# Altium footprint library JL_PCB.PCBLIB: 1129 footprints (part 69 of 72)
Each footprint in its own frame and in the unit in brackets; x right, y up, seen from the top. Pads: shape width x height; smd on the part's side, far side on the other; paste and mask are expansions set on the pad; w line width, h text height; cw(c..) or ccw(c..) is an arc to the next point about the centre after c.
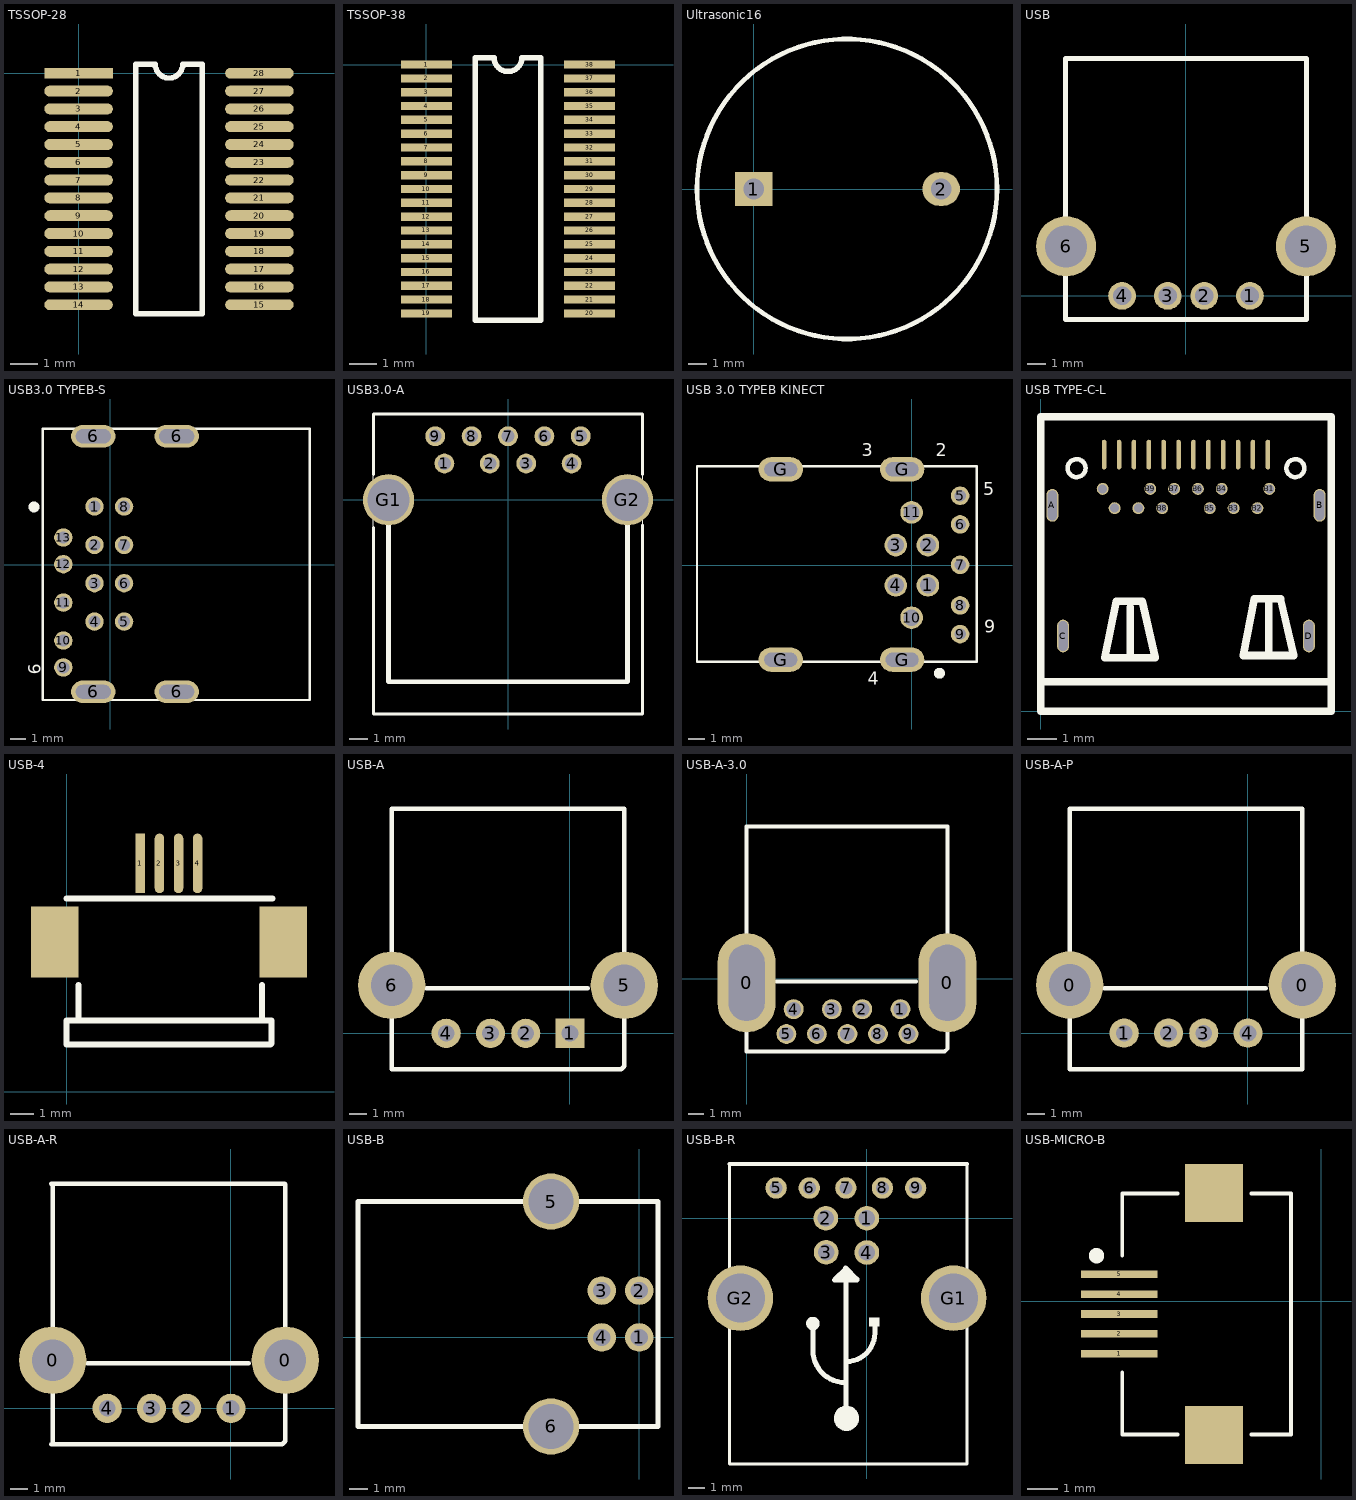
[diagram p68: the footprints below, top view; thin cyan lines are the x and y axes]

## TSSOP-28 [mm]
pads (28):
  rect 2.5x0.4 smd: 1(0,0)
  oval 2.5x0.4 smd: 2(0,-0.65) 3(0,-1.3) 4(0,-1.95) 5(0,-2.6) 6(0,-3.25) 7(0,-3.9) 8(0,-4.55) 9(0,-5.2) 10(0,-5.85) 11(0,-6.5) 12(0,-7.15) 13(0,-7.8) 14(0,-8.45) 15(6.6,-8.45) 16(6.6,-7.8) 17(6.6,-7.15) 18(6.6,-6.5) 19(6.6,-5.85) 20(6.6,-5.2) 21(6.6,-4.55) 22(6.6,-3.9) 23(6.6,-3.25) 24(6.6,-2.6) 25(6.6,-1.95) 26(6.6,-1.3) 27(6.6,-0.65) 28(6.6,0)
TopOverlay:
  lines w0.2: 2.085,-8.775 4.515,-8.775 4.515,0.325 3.8,0.325 cw(c3.3,0.325) 2.8,0.325 2.085,0.325 2.085,-8.775
3D body "TSSOP28.STEP": height 1.05, standoff 0, extent -0.049,-9.116 6.551,0.684

## TSSOP-38 [mm]
pads (38):
  rect 1.85x0.3 smd: 1(0,0) 2(0,-0.5) 3(0,-1) 4(0,-1.5) 5(0,-2) 6(0,-2.5) 7(0,-3) 8(0,-3.5) 9(0,-4) 10(0,-4.5) 11(0,-5) 12(0,-5.5) 13(0,-6) 14(0,-6.5) 15(0,-7) 16(0,-7.5) 17(0,-8) 18(0,-8.5) 19(0,-9) 20(5.9,-9) 21(5.9,-8.5) 22(5.9,-8) 23(5.9,-7.5) 24(5.9,-7) 25(5.9,-6.5) 26(5.9,-6) 27(5.9,-5.5) 28(5.9,-5) 29(5.9,-4.5) 30(5.9,-4) 31(5.9,-3.5) 32(5.9,-3) 33(5.9,-2.5) 34(5.9,-2) 35(5.9,-1.5) 36(5.9,-1) 37(5.9,-0.5) 38(5.9,0)
TopOverlay:
  lines w0.2: 1.76,-9.25 1.76,0.25 2.45,0.25 ccw(c2.95,0.25) 3.45,0.25 4.14,0.25 4.14,-9.25 1.76,-9.25

## Ultrasonic16 [mm]
pads (2):
  rect 2x1.8 hole 1.1: 1(0,0)
  oval 2x1.8 hole 1.1: 2(10,0)
TopOverlay:
  circle w0.254: c4.978,0 r8

## USB [mm]
pads (6):
  round 1.524 hole 1: 1(3.503,0) 2(1.003,0) 3(-0.997,0) 4(-3.497,0)
  round 3.3 hole 2.3: 5(6.573,2.71) 6(-6.567,2.71)
TopOverlay:
  lines w0.254: -6.597,-1.295 -6.597,13.005 6.603,13.005 6.603,-1.295 -6.597,-1.295

## USB3.0 TYPEB-S [mm] "KINECT USB3.0 TYPEB-S WITH 12V POWER"
pads (17):
  round 1.2 hole 0.8: 1(-1.016,3.81) 2(-1.016,1.31) 3(-1.016,-1.19) 4(-1.016,-3.69) 5(0.914,-3.69) 6(0.914,-1.19) 7(0.914,1.31) 8(0.914,3.81) 9(-3.048,-6.68) 10(-3.048,-4.928) 11(-3.048,-2.451) 12(-3.048,0.051) 13(-3.048,1.791)
  oval 2.9x1.45 hole 0.889 slot 2.286 at 0 deg: 6(-1.092,-8.268) 6(4.343,-8.268)
  oval 2.9x1.45 hole 0.914 slot 2.286 at 0 deg: 6(-1.092,8.395) 6(4.343,8.395)
TopOverlay:
  circle w0.5: c-4.965,3.785 r0.102
  lines w0.152: 13.005,-8.801 -4.394,-8.801 -4.394,8.877 13.005,8.877 ; 13.03,-8.801 13.03,8.877
  text "9" at -5.347,-6.452 h0.8
BottomOverlay:
  text "4" at -1.448,-5.118 h0.8
  text "5" at 1.994,-4.14 h0.8
  text "8" at 1.791,4.089 h0.8
  text "13" at -5.512,1.295 h0.8

## USB3.0-A [mil] "USB3.0-A"
pads (11):
  round 43 hole 28: 1(-137.79,78.74) 2(-39.37,78.74) 3(39.37,78.74) 4(137.79,78.74) 5(157.48,137.79) 6(78.74,137.79) 7(0,137.79) 8(-78.74,137.79) 9(-157.48,137.79)
  round 111 hole 91: G1(-258.66,0) G2(258.66,0)
TopOverlay:
  lines w1: -291.34,-463.78 -291.34,185.83 ; 291.34,-463.78 291.34,185.83
  lines w6: -291.34,-60 -291.34,-463.78 291.34,-463.78 291.34,-55 ; -291.34,55 -291.34,185.83 291.34,185.83 291.34,55
  lines w10: -258.66,0 -258.66,-393.66 258.66,-393.66 258.66,0
3D body "85r4853_1932258-1.stp": height 300.2, standoff -150.77, extent -316.93,-468.82 316.93,180

## USB 3.0 TYPEB KINECT [mm] "USB 3.0 TYPEB KINECT"
pads (15):
  round 1.4 hole 1: 1(1.016,-1.245) 2(1.016,1.245) 3(-0.978,1.245) 4(-0.978,-1.245) 10(0,-3.251) 11(0,3.277)
  round 1.15 hole 0.7: 5(3.01,4.305) 6(3.01,2.527) 7(3.01,0.025) 8(3.01,-2.489) 9(3.01,-4.267)
  oval 2.75x1.5 hole 0.889 slot 2.032 at 0 deg: G(-8.103,-5.855) G(-8.103,5.944) G(-0.584,-5.855) G(-0.584,5.944)
TopOverlay:
  circle w0.5: c1.727,-6.693 r0.089
  lines w0.152: -13.297,-5.969 -13.297,6.147 4.051,6.147 4.051,-5.969 -13.297,-5.969
  text "5" at 4.432,4.331 h0.8
  text "9" at 4.496,-4.191 h0.8
  text "4" at -2.705,-7.404 h0.8
  text "2" at 1.486,6.744 h0.8
  text "3" at -3.086,6.756 h0.8
BottomOverlay:
  circle w0.5: c1.676,-2.819 r0.114
  text "2" at 1.753,2.451 h0.7
  text "3" at -2.172,1.168 h0.7
  text "4" at -2.134,-1.537 h0.7
  text "9" at 4.953,-4.14 h0.7
  text "10" at -0.978,-3.416 h0.7
  text "11" at -0.953,3.289 h0.7
  text "5" at 4.902,4.394 h0.7

## USB TYPE-C-L [mm]
pads (28):
  oval 0.4x1.1 hole 0.3 slot 1 at 90 deg: A(0.385,6.92) B(9.365,6.92) C(0.745,2.53) D(9.005,2.53)
  oval 0.15x1 smd: A1(2.125,8.625) A2(2.625,8.625) A3(3.125,8.625) A4(3.625,8.625) A5(4.125,8.625) A6(4.625,8.625) A7(5.125,8.625) A8(5.625,8.625) A9(6.125,8.625) A10(6.625,8.625) A11(7.125,8.625) A12(7.625,8.625)
  round 0.4 hole 0.3: B1(7.675,7.475) B2(7.275,6.825) B3(6.475,6.825) B4(6.075,7.475) B5(5.675,6.825) B6(5.275,7.475) B7(4.475,7.475) B8(4.075,6.825) B9(3.675,7.475) B10(3.275,6.825) B11(2.475,6.825) B12(2.075,7.475)
TopOverlay:
  circle w0.15: c1.2,8.17 r0.301
  circle w0.15: c8.55,8.17 r0.301
  lines w0.254: 0,0.3 0,0 ; 0,1 9.75,1 ; 0,9.87 0,0 ; 0,9.9 9.75,9.9 ; 0.7,1 8.75,1 ; 3,1.8 3,3.5 ; 7.65,1.876 7.65,3.776 ; 9.75,9.87 9.75,0 0,0 ; 2.15,1.8 2.525,3.7 3.4,3.7 3.845,1.8 2.15,1.8 ; 6.8,1.876 8.495,1.876 8.05,3.776 7.175,3.776 6.8,1.876
3D body: height 2.5, standoff 2, extent 0.377,-0.275 9.352,10.125
3D body: height 2.58, standoff 1.32, extent -0.25,-0.275 1.005,10.125
3D body: height 2.53, standoff 1.27, extent 8.725,-0.275 9.98,10.125
3D body: height 2, standoff 0.1, extent -0.275,-0.25 1,10.15
3D body: height 2, standoff 0.1, extent 8.7,-0.275 9.975,10.125
3D body: height 0.1, standoff 0, extent 2,8.125 2.25,9.125
3D body: height 0, standoff -1, extent 1.926,7.325 2.225,7.625
3D body: height 0, standoff -1, extent 3.526,7.325 3.825,7.625
3D body: height 0, standoff -1, extent 4.326,7.325 4.625,7.625
3D body: height 0, standoff -1, extent 5.126,7.325 5.425,7.625
3D body: height 0, standoff -1, extent 5.926,7.325 6.225,7.625
3D body: height 0, standoff -1, extent 7.526,7.325 7.825,7.625
3D body: height 0, standoff -1, extent 7.126,6.675 7.425,6.975
3D body: height 0, standoff -1, extent 6.326,6.675 6.625,6.975
3D body: height 0, standoff -1, extent 5.526,6.675 5.825,6.975
3D body: height 0, standoff -1, extent 3.926,6.675 4.225,6.975
3D body: height 0, standoff -1, extent 3.126,6.675 3.425,6.975
3D body: height 0, standoff -1, extent 2.326,6.675 2.625,6.975
3D body: height 0.1, standoff 0, extent 2.5,8.125 2.75,9.125
3D body: height 0.1, standoff 0, extent 3,8.125 3.25,9.125
3D body: height 0.1, standoff 0, extent 3.5,8.125 3.75,9.125
3D body: height 0.1, standoff 0, extent 4,8.125 4.25,9.125
3D body: height 0.1, standoff 0, extent 4.5,8.125 4.75,9.125
3D body: height 0.1, standoff 0, extent 5,8.125 5.25,9.125
3D body: height 0.1, standoff 0, extent 5.5,8.125 5.75,9.125
3D body: height 0.1, standoff 0, extent 5.975,8.125 6.225,9.125
3D body: height 0.1, standoff 0, extent 6.5,8.125 6.75,9.125
3D body: height 0.1, standoff 0, extent 6.975,8.1 7.225,9.1
3D body: height 0.1, standoff 0, extent 7.5,8.125 7.75,9.125
3D body: height 0.1, standoff -1, extent 0.26,6.42 0.51,7.42
3D body: height 0.1, standoff -1, extent 9.24,6.42 9.49,7.42
3D body: height 0.1, standoff -1, extent 0.62,2.03 0.87,3.03
3D body: height 0.1, standoff -1, extent 8.88,2.03 9.13,3.03
3D body: height 2.5, standoff 2, extent 6.8,1.875 8.475,3.725
3D body: height 2.5, standoff 2, extent 2.137,1.85 3.812,3.7

## USB-4 [mm]
pads (6):
  rect 0.4x2.5 smd: 1(3.1,9.6)
  oval 0.4x2.5 smd: 2(3.9,9.6) 3(4.7,9.6) 4(5.5,9.6)
  rect 2x3 smd: ""(-0.5,6.3) ""(9.1,6.3)
TopOverlay:
  lines w0.254: 0,8.128 8.636,8.128 ; 0.5,3 0.5,4.5 ; 8.2,3 8.2,4.5 ; 0,2 0,3 8.6,3 8.6,2.036 8.564,2 0,2

## USB-A [mil]
pads (6):
  rect 65x65 hole 37: 1(0,0)
  round 65 hole 37: 2(-98.5,0) 3(-177,0) 4(-275.6,0)
  round 150 hole 93: 5(121,107) 6(-397,107)
TopOverlay:
  lines w10: -320,100 40,100 ; -397,-80 114,-80 121,-73 121,107 121,500 -397,500 -397,107 -397,-80
3D body "User Library-USB-A-01.step": height 274.23, standoff -164.75, extent -449.02,-45 173.02,494.37

## USB-A-3.0 [mil] "USB3.0TYPEA"
pads (11):
  oval 150x255.91 hole 93 slot 196.85 at 90 deg: 0(0,-10) 0(518,-10)
  round 51.18 hole 37: 1(397,-78) 2(298.5,-78) 3(220,-78) 4(121.4,-78) 5(102.6,-142) 6(181.34,-142) 7(260.08,-142) 8(338.82,-142) 9(417.56,-142)
TopOverlay:
  lines w10: 77,-7 437,-7 ; 0,-187 511,-187 518,-180 518,0 518,393 0,393 0,0 0,-187
3D body "User Library-USB-A-01.step": height 274.23, standoff -164.75, extent -54.02,-122 568.02,417.37

## USB-A-P [mil]
pads (6):
  round 150 hole 93: 0(-397,107) 0(121,107)
  round 65 hole 37: 1(-275.6,0) 2(-177,0) 3(-98.5,0) 4(0,0)
TopOverlay:
  lines w10: -320,100 40,100 ; -397,-80 121,-80 121,107 121,499 -397,499 -397,107 -397,-80

## USB-A-R [mil]
pads (6):
  round 150 hole 93: 0(-397,107) 0(121,107)
  round 65 hole 37: 1(0,0) 2(-98.5,0) 3(-177,0) 4(-275.6,0)
TopOverlay:
  lines w10: -400,-80 114,-80 121,-73 121,107 121,499 120,500 -400,500 -397,497 -397,477 -397,107 -397,-77 ; -320,100 40,100

## USB-B [mm]
pads (6):
  round 1.524 hole 0.92: 1(0,0) 2(0,2.5) 3(-2,2.5) 4(-2,0)
  round 3 hole 2.4: 5(-4.7,7.25) 6(-4.7,-4.75)
TopOverlay:
  lines w0.254: -15,-4.75 -15,7.25 1,7.25 1,-4.75 -15,-4.75

## USB-B-R [mm]
pads (11):
  round 1.5 hole 1: 1(0,0) 2(-2.5,0) 3(-2.489,-2.083) 4(0,-2.094)
  round 1.3 hole 0.8: 5(-5.537,1.84) 6(-3.512,1.84) 7(-1.283,1.84) 8(0.945,1.84) 9(2.971,1.84)
  round 4 hole 3: G1(5.283,-4.877) G2(-7.713,-4.874)
TopOverlay:
  rectangle: 0.13,-6.599 0.78,-6.049
  rectangle: -3.395,-6.499 -3.195,-6.299
  rectangle: -1.57,-12.674 -0.87,-11.724
  lines w0.203: -8.382,3.302 -8.382,-14.986 6.096,-14.986 6.096,3.302
  lines w0.254: -8.382,3.302 6.096,3.302
  lines w0.305: -3.295,-6.549 -3.295,-8.049 ccw(c-1.32,-8.049) -1.32,-10.024 ; -3.081,-6.573 cw(c-3.295,-6.424) -3.045,-6.5 ; -1.97,-3.767 -0.62,-3.767 -0.87,-3.517 -1.695,-3.517 ; -1.945,-3.742 -1.27,-3.067 ; -1.67,-11.874 ccw(c-1.27,-12.124) -1.621,-11.808 ; -1.572,-11.675 ccw(c-1.245,-12.199) -1.525,-11.649 ; -1.295,-3.317 -1.295,-3.042 -0.62,-3.717 ; -1.27,-11.949 -1.27,-3.474 ; -1.27,-8.749 ccw(c-1.27,-6.999) 0.48,-6.999 0.48,-6.649 ; -1.146,-11.947 ccw(c-1.32,-12.074) -1.107,-12.047
3D body "usb3_a-usb3_b.stp": height 13.21, standoff -2.17, extent -8.382,-14.992 6.018,3.308

## USB-MICRO-B [mm] "Connector; USB2.0, Type A, SM; 5 Position; Right Angle"
height 3.9
pads (7):
  rect 2.5x0.25 smd: 1(-6.6,-1.719) 2(-6.6,-1.069) 3(-6.6,-0.419) 4(-6.6,0.231) 5(-6.6,0.881)
  rect 1.9x1.9 smd: ""(-3.505,-4.369) ""(-3.505,3.531)
TopOverlay:
  circle w0.25: c-7.348,1.486 r0.125
  lines w0.127: -6.508,-4.356 -4.7,-4.356 ; -6.508,-4.319 -6.508,-2.324 ; -6.508,1.486 -6.508,3.481 ; -6.508,3.518 -4.7,3.518 ; -2.286,-4.356 -1,-4.356 ; -2.286,3.518 -1,3.518 ; -1,-4.319 -1,3.481
3D body "Micro USB.STP": height 2.71, standoff -0.23, extent -6.358,-4.422 -0.928,3.558